# Altium footprint library PCB贴片元件封装库.pcblib: 366 footprints (part 16 of 23)
Each footprint in its own frame and in the unit in brackets; x right, y up, seen from the top. Pads: shape width x height; smd on the part's side, far side on the other; paste and mask are expansions set on the pad; w line width, h text height; cw(c..) or ccw(c..) is an arc to the next point about the centre after c.
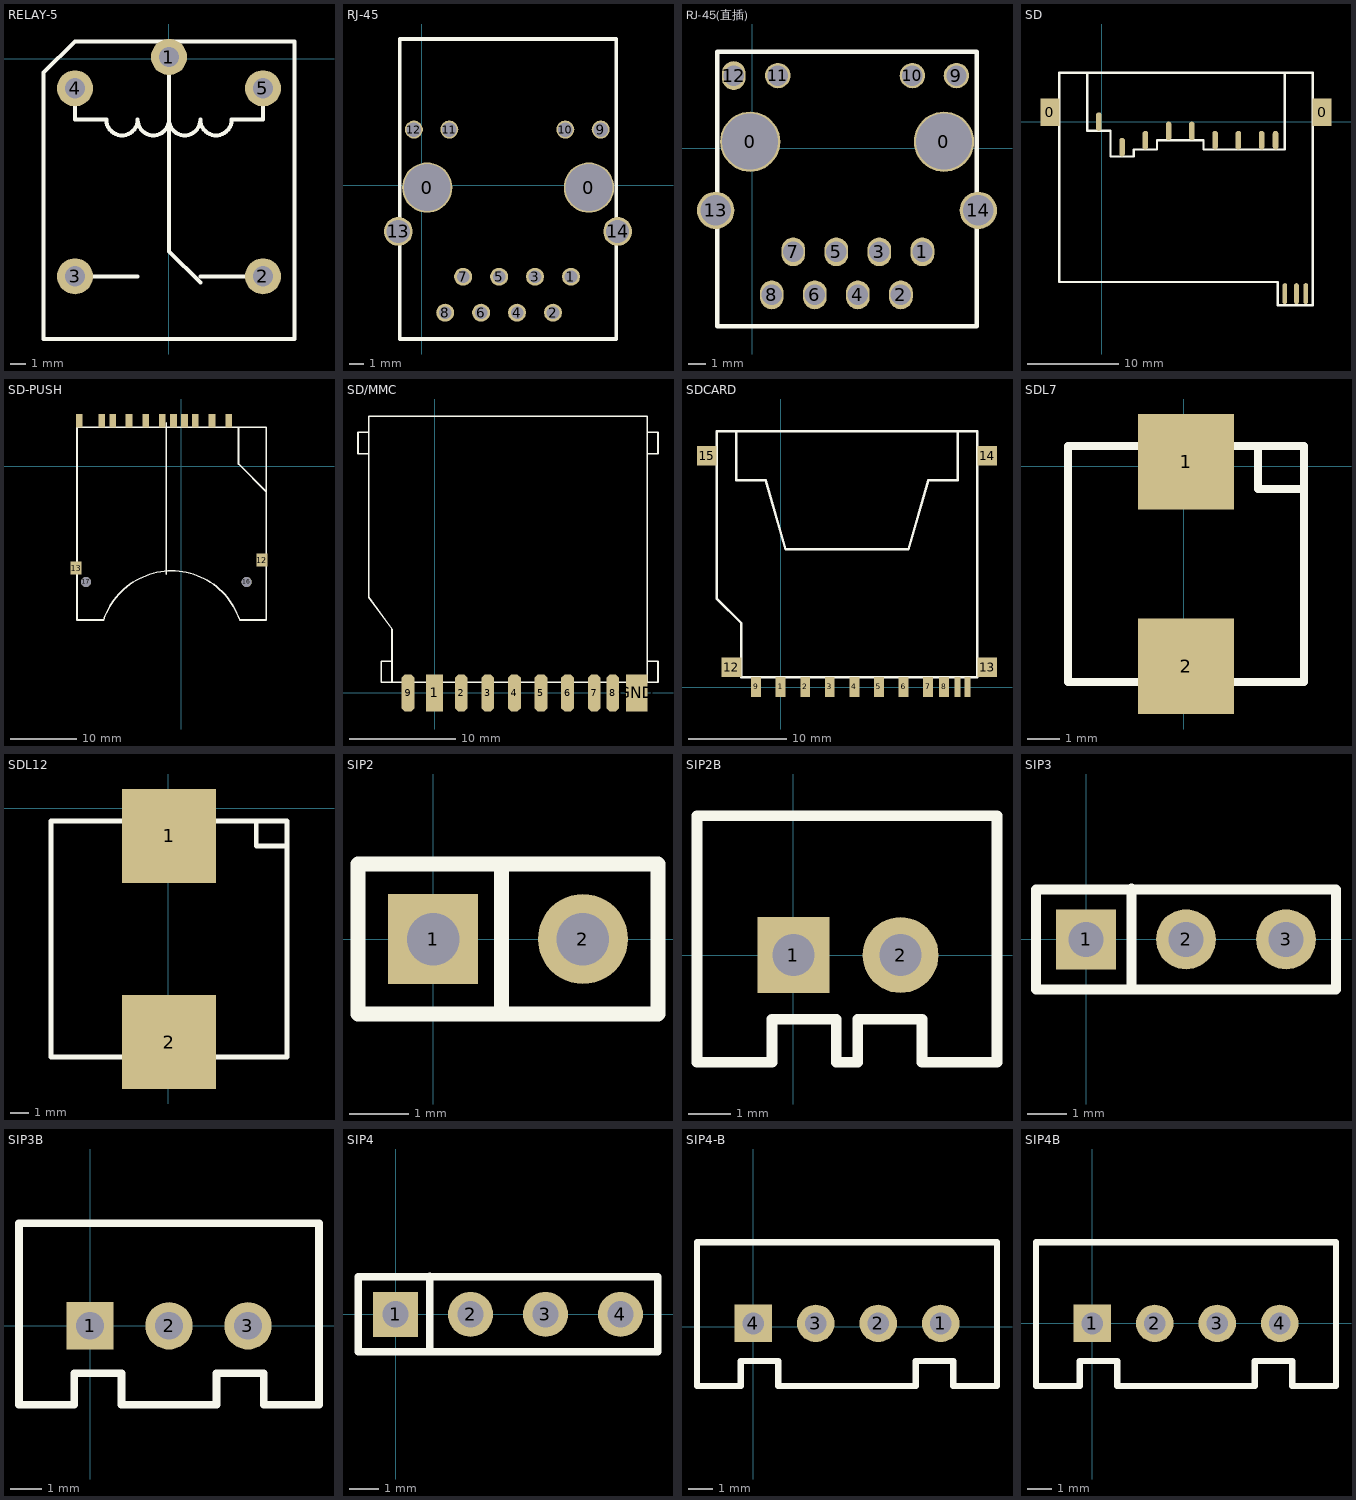
[diagram p15: the footprints below, top view; thin cyan lines are the x and y axes]

## RELAY-5 [mm]
pads (5):
  round 2.3 hole 1.3: 1(0.023,0.106) 2(6.023,-13.894) 3(-5.977,-13.894) 4(-5.977,-1.894) 5(6.023,-1.894)
TopOverlay:
  lines w0.254: -5.977,-2.894 -5.977,-3.894 -3.977,-3.894 ccw(c-2.977,-3.894) -1.977,-3.894 ccw(c-0.977,-3.894) 0.023,-3.894 ccw(c1.023,-3.894) 2.023,-3.894 ccw(c3.023,-3.894) 4.023,-3.894 6.023,-3.894 6.023,-2.894 ; -4.977,-13.894 -1.977,-13.894 ; 0.023,-0.894 0.023,-12.294 2.023,-14.294 ; 2.023,-13.894 5.023,-13.894 ; -7.977,-17.894 8.023,-17.894 8.023,1.106 -5.977,1.106 -7.977,-0.894 -7.977,-17.894

## RJ-45 [mil]
pads (16):
  round 140 hole 130: 0(15,-6.97) 0(465,-6.97)
  round 50 hole 35: 1(415,-255) 2(365,-355) 3(315,-255) 4(265,-355) 5(215,-255) 6(165,-355) 7(115,-255) 8(65,-355)
  round 50 hole 40: 9(497.68,154.45) 10(399.25,154.45) 11(76.42,154.45) 12(-22.01,154.45)
  round 80 hole 65: 13(-65.31,-129.02)
  round 80 hole 64: 14(544.92,-129.02)
TopOverlay:
  lines w10: -61.38,-428.23 540.98,-428.23 540.98,406.42 -61.38,406.42 -61.38,-428.23

## RJ-45(直插) [mm]
pads (16):
  round 3.556 hole 3.302: 0(-0.127,0.4) 0(11.303,0.4)
  oval 1.4x1.7 hole 1.2: 1(10.033,-6.096) 2(8.763,-8.636) 3(7.493,-6.096) 4(6.223,-8.636) 5(4.953,-6.096) 6(3.683,-8.636) 7(2.413,-6.096) 8(1.143,-8.636) 12(-1.1,4.3)
  round 1.5 hole 1.2: 9(12.04,4.3) 10(9.44,4.3) 11(1.5,4.3)
  round 2.2 hole 1.8: 13(-2.167,-3.65) 14(13.333,-3.65)
TopOverlay:
  lines w0.254: -2.067,-10.496 13.233,-10.496 13.233,5.715 -2.067,5.715 -2.067,-10.496

## SD [mil]
pads (14):
  rect 80x120 smd: 0(-222,40) 0(948,40)
  oval 24x80 smd: 1(-12,0) 2(88,-110) 3(188,-80) 4(288,-40) 5(388,-40) 6(488,-80) 7(588,-80) 8(688,-80) 9(748,-80)
  oval 20x90 smd: 10(878,-740) 11(838,-740) 12(788,-740)
TopOverlay:
  lines w10: -62,210 -62,-40 38,-40 38,-150 138,-150 138,-120 238,-120 238,-80 438,-80 438,-120 788,-120 788,210 ; -182,-690 -182,210 908,210 908,-790 758,-790 758,-690 -182,-690

## SD-PUSH [mm]
pads (15):
  rect 1x2 smd: 1(4.652,6.897) 2(2.152,6.897) 3(-1.148,6.897) 4(-2.848,6.897) 5(-5.348,6.897) 6(-7.848,6.897) 7(-10.273,6.897) 8(-11.973,6.897) 9(7.152,6.897) 10(-15.323,6.897) 11(0.502,6.897)
  rect 1.6x2 smd: 12(12.177,-14.103) 13(-15.823,-15.303)
  round 1.5 hole 1.5: 16(9.877,-17.403) 17(-14.323,-17.403)
TopOverlay:
  lines w0.2: -11.655,-23.125 cw(c-1.424,-26.508) 8.808,-23.126
  lines w0.254: -11.673,-23.119 -15.673,-23.119 -15.673,5.881 12.827,5.881 12.827,-23.119 8.827,-23.119 ; -2.223,-16.253 -2.223,6.597 ; 8.645,5.881 8.645,0.381 12.828,-3.802

## SD/MMC [mm]
pads (10):
  rect 1.6x3.5 smd: 1(0,0)
  oct 1.2x3.5 smd: 2(2.5,0) 3(5,0) 4(7.5,0) 5(10,0) 6(12.5,0) 7(15,0) 8(16.75,0) 9(-2.5,0)
  rect 2x3.5 smd: GND(19,0)
TopOverlay:
  lines w0.15: -6.2,22.5 -7.2,22.5 -7.2,24.5 -6.2,24.5 ; -4,1 -4,6 -6.2,9 -6.2,26 20,26 20,1 ; -4,3 -5,3 -5,1 21,1 21,3 20,3 ; 20,22.5 21,22.5 21,24.5 20,24.5

## SDCARD [mm]
pads (15):
  rect 1x2 smd: 1(0.007,0.016) 2(2.507,0.016) 3(5.007,0.016) 4(7.507,0.016) 5(10.007,0.016) 6(12.507,0.016) 7(15.007,0.016) 8(16.632,0.016) 9(-2.493,0.016)
  rect 0.6x2 smd: 10(19.007,0.016) 11(18.007,0.016)
  rect 2x2 smd: 12(-4.993,2.016) 13(21.007,2.016) 14(21.007,23.516) 15(-7.493,23.516)
TopOverlay:
  lines w0.254: -4.493,26.016 -4.493,21.016 -1.493,21.016 0.507,14.016 13.007,14.016 15.007,21.016 18.007,21.016 18.007,26.016 ; -6.493,9.016 -3.993,6.516 -3.993,1.016 20.007,1.016 20.007,26.016 -6.493,26.016 -6.493,9.016

## SDL7 [mm]
pads (2):
  rect 3x3 smd: 1(0.076,0.135) 2(0.076,-6.265)
TopOverlay:
  lines w0.254: 2.337,0.635 2.337,-0.711 3.776,-0.711 ; -3.624,-6.765 3.776,-6.765 3.776,0.635 -3.624,0.635 -3.624,-6.765

## SDL12 [mm]
pads (2):
  rect 5x5 smd: 1(0.051,-1.46) 2(0.051,-12.46)
TopOverlay:
  lines w0.254: 4.699,-0.66 4.699,-2.007 6.351,-2.007 ; -6.249,-13.26 6.351,-13.26 6.351,-0.66 -6.249,-0.66 -6.249,-13.26

## SIP2 [mil]
pads (2):
  rect 60x60 hole 35: 1(0,0)
  round 60 hole 35: 2(100,0)
TopOverlay:
  lines w10: 45.67,-49.21 45.67,50 ; -50,-50 -50,50 150,50 150,-50 -50,-50

## SIP2B [mm]
pads (2):
  rect 1.7x1.8 hole 1: 1(0,0)
  round 1.8 hole 1: 2(2.54,0)
TopOverlay:
  lines w0.254: -2.286,-2.54 -0.508,-2.54 -0.508,-1.524 1.016,-1.524 1.016,-2.54 1.524,-2.54 1.524,-1.524 3.048,-1.524 3.048,-2.54 4.826,-2.54 4.826,3.302 -2.286,3.302 -2.286,-2.54

## SIP3 [mil]
pads (3):
  rect 60x60 hole 35: 1(0,0)
  round 60 hole 35: 2(100,0) 3(200,0)
TopOverlay:
  lines w10: 45.67,-49.21 45.67,50.79 ; -50,-50 -50,50 250,50 250,-50 -50,-50

## SIP3B [mil]
pads (3):
  rect 60x60 hole 35: 1(0,0)
  round 60 hole 35: 2(100,0) 3(200,0)
TopOverlay:
  lines w10: -90,-100 -90,130 290,130 290,-100 220,-100 220,-60 160,-60 160,-100 40,-100 40,-60 -20,-60 -20,-100 -90,-100

## SIP4 [mil]
pads (4):
  rect 60x60 hole 35: 1(0,0)
  round 60 hole 35: 2(100,0) 3(200,0) 4(300,0)
TopOverlay:
  lines w10: 45.67,-49.21 45.67,50.79 ; -50,-50 350,-50 350,50 -50,50 -50,-50

## SIP4-B [mil]
pads (4):
  round 60 hole 35: 1(300,5) 2(200,5) 3(100,5)
  rect 60x60 hole 35: 4(0,5)
TopOverlay:
  lines w10: -90,-95 -20,-95 -20,-55 40,-55 40,-95 260,-95 260,-55 320,-55 320,-95 390,-95 390,135 -90,135 -90,-95

## SIP4B [mil]
pads (4):
  rect 60x60 hole 35: 1(0,0)
  round 60 hole 35: 2(100,0) 3(200,0) 4(300,0)
TopOverlay:
  lines w10: -90,-100 -20,-100 -20,-60 40,-60 40,-100 260,-100 260,-60 320,-60 320,-100 390,-100 390,130 -90,130 -90,-100